# Altium footprint library MC1.PcbLib: 70 footprints (part 2 of 5)
Each footprint in its own frame and in the unit in brackets; x right, y up, seen from the top. Pads: shape width x height; smd on the part's side, far side on the other; paste and mask are expansions set on the pad; w line width, h text height; cw(c..) or ccw(c..) is an arc to the next point about the centre after c.
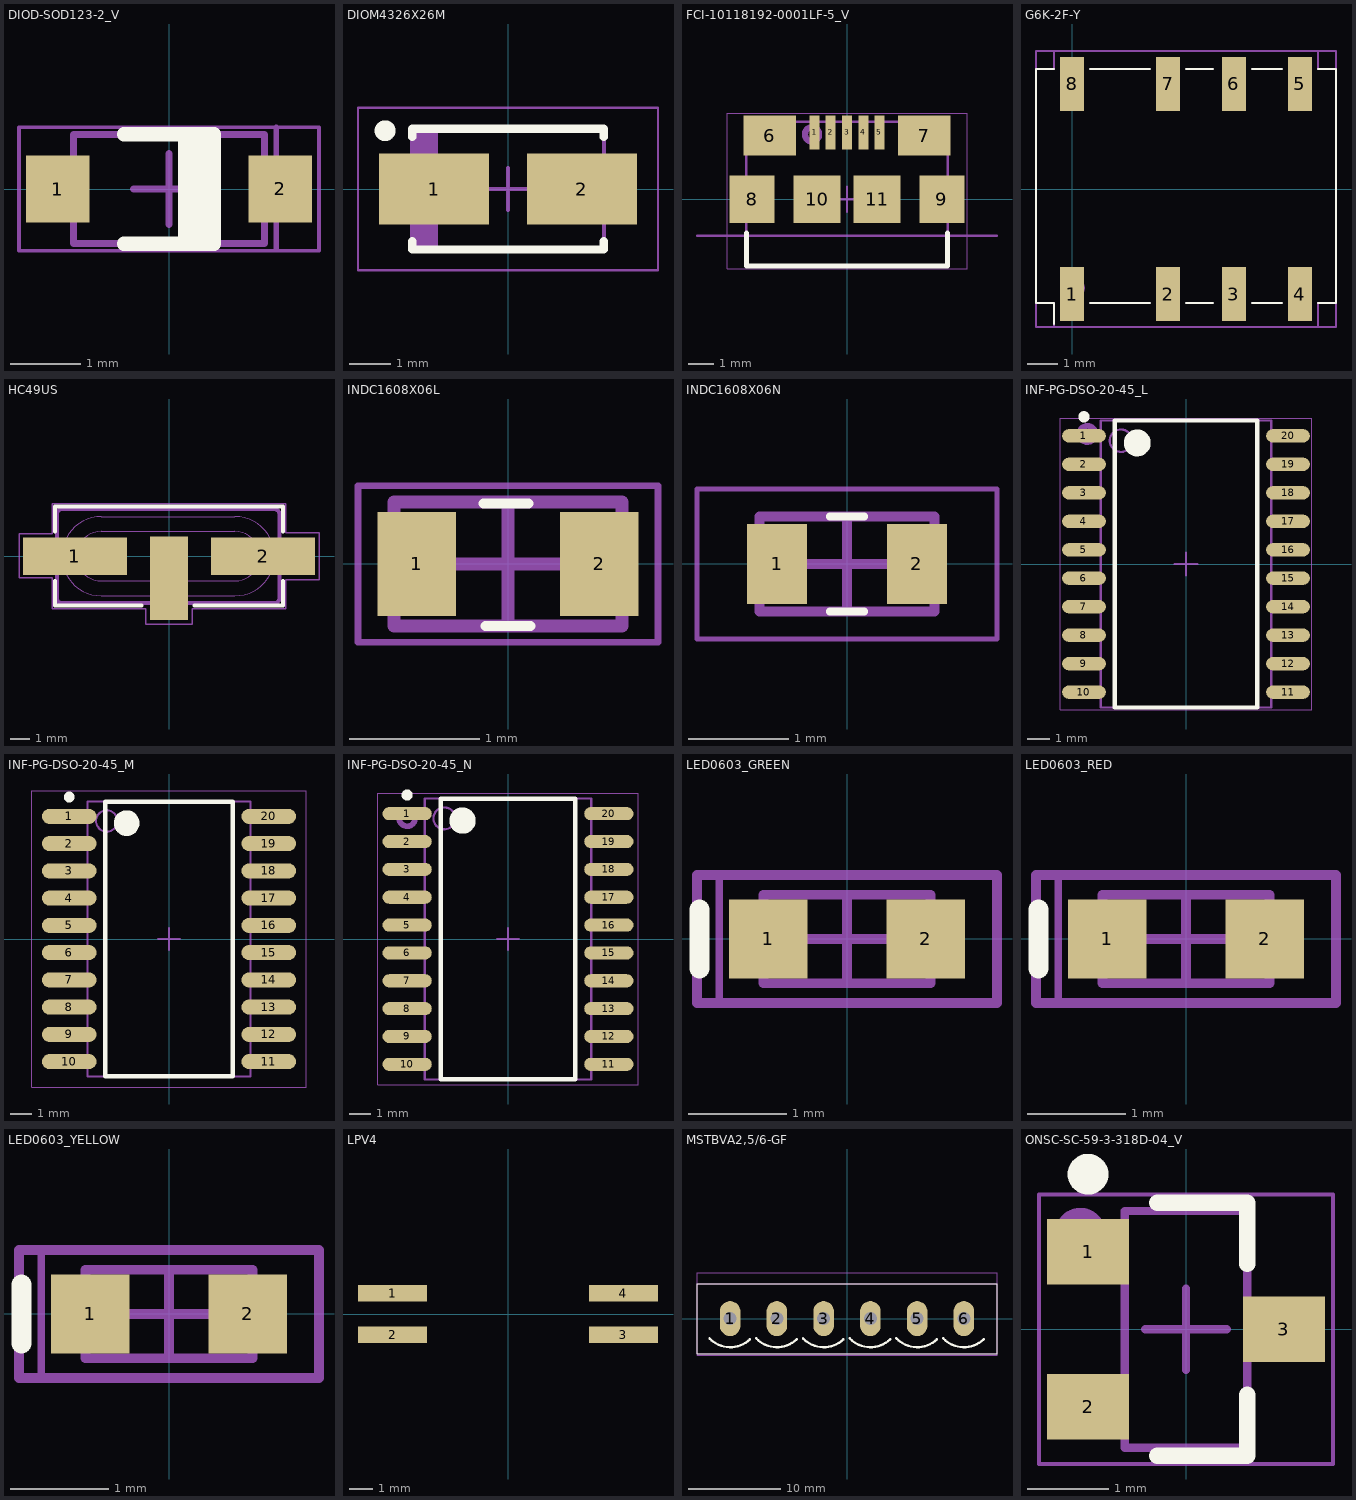
[diagram p1: the footprints below, top view; thin cyan lines are the x and y axes]

## DIOD-SOD123-2_V [mm] "SOD123, 2-Leads, Body 2.7x1.55mm, Height 1.45mm"
height 1.45
pads (2):
  rect 0.9x0.95 smd: 1(-1.575,0) 2(1.575,0)
Top Overlay:
  rectangle: 0.127,-0.825 0.635,0.762
  lines w0.2: -0.635,-0.775 0.635,-0.775 0.635,0.775 -0.635,0.775
Top Courtyard:
  lines w0.05: -2.125,-0.875 -2.125,0.875 2.125,0.875 2.125,-0.875 -2.125,-0.875
  lines w0.1: -0.5,0 0.5,0 ; 0,-0.5 0,0.5
Mechanical 13:
  lines w0.1: -1.35,-0.775 -1.35,0.775 1.35,0.775 1.35,-0.775 -1.35,-0.775
Mechanical 15:
  lines w0.05: -2.125,-0.875 -2.125,0.875 2.125,0.875 2.125,-0.875 -2.125,-0.875
  lines w0.1: -0.5,0 0.5,0 ; 0,-0.5 0,0.5
Top Assembly (Mech29):
  lines w0.05: -2.125,-0.875 -2.125,0.875 2.125,0.875 2.125,-0.875 -2.125,-0.875
  lines w0.076: 1.521,-0.86 1.521,0.875
  text "'.Designator'" at -2.878,-0.212 h0.51
3D body: height 1.45, standoff 0, extent -1.35,-0.775 1.35,0.775

## DIOM4326X26M [mm] "Molded Diode, 2-Leads, Body 4.28x2.58mm, IPC Low Density"
height 2.65
pads (2):
  rect 2.65x1.7 smd: 1(-1.775,0) 2(1.775,0)
Top Overlay:
  circle w0.25: c-2.95,1.4 r0.125
  lines w0.2: -2.3,-1.25 -2.3,-1.45 2.3,-1.45 2.3,-1.25 ; -2.3,1.25 -2.3,1.45 2.3,1.45 2.3,1.25
Top Courtyard:
  lines w0.05: -3.6,-1.95 -3.6,1.95 3.6,1.95 3.6,-1.95 -3.6,-1.95
  lines w0.1: -0.5,0 0.5,0 ; 0,-0.5 0,0.5
Top Assembly (Mech29):
  rectangle: -2.3,-1.45 -1.681,1.45
  lines w0.1: -2.3,-1.45 -2.3,1.45 2.3,1.45 2.3,-1.45 -2.3,-1.45
  text "'.Designator'" at -2.878,-0.212 h0.51
3D body "DIOM4326X26M.step": height 2.65, standoff 0, extent -2.52,-1.45 2.52,1.45

## FCI-10118192-0001LF-5_V [mm] "SMD, 5-Leads, Body 8.05x5.77mm, Pitch 0.65mm"
height 2.7
pads (11):
  rect 0.4x1.35 smd: 1(-1.3,2.675) 2(-0.65,2.675) 3(0,2.675) 4(0.65,2.675) 5(1.3,2.675)
  rect 2.1x1.6 smd: 6(-3.1,2.55) 7(3.1,2.55)
  rect 1.8x1.9 smd: 8(-3.8,0) 9(3.8,0)
  rect 1.9x1.9 smd: 10(-1.2,0) 11(1.2,0)
Top Overlay:
  lines w0.2: -4.025,-1.35 -4.025,-2.67 4.025,-2.67 4.025,-1.35
Mechanical 1:
  lines w0.1: -6,-1.45 6,-1.45
  text "PCB Edge" at -13.208,-0.762 h1
Top Courtyard:
  lines w0.05: -4.8,-2.77 -4.8,3.45 4.8,3.45 4.8,-2.77 -4.8,-2.77
  lines w0.1: -0.5,0 0.5,0 ; 0,-0.5 0,0.5
Mechanical 13:
  lines w0.1: -4.025,-2.67 -4.025,3.1 4.025,3.1 4.025,-2.67 -4.025,-2.67
Mechanical 15:
  lines w0.05: -4.8,-2.77 -4.8,3.45 4.8,3.45 4.8,-2.77 -4.8,-2.77
  lines w0.1: -0.5,0 0.5,0 ; 0,-0.5 0,0.5
Top Assembly (Mech29):
  circle w0.254: c-1.4,2.6 r0.283
  lines w0.05: -4.8,-2.77 -4.8,3.45 4.8,3.45 4.8,-2.77 -4.8,-2.77
  text "'.Designator'" at -2.878,-0.212 h0.51
3D body "User Library-10118192.STEP": height 2.78, standoff -0.23, extent -3.956,-2.986 3.956,2.675

## G6K-2F-Y [mm] "Footprint for G6K-2F-Y Omrom relays"
pads (8):
  rect 0.8x1.8 smd paste+0 mask+0.102: 1(0,-3.5) 2(3.2,-3.5) 3(5.4,-3.5) 4(7.6,-3.5) 5(7.6,3.5) 6(5.4,3.5) 7(3.2,3.5) 8(0,3.5)
Top Overlay:
  lines w0.076: -0.6,-4.5 -0.6,-3.8 -1.2,-3.8 -1.2,4 -0.6,4 ; 0.6,-3.8 2.6,-3.8 ; 0.6,4 2.6,4 ; 3.8,-3.8 4.7,-3.8 ; 3.8,4 4.7,4 ; 6,-3.8 7,-3.8 ; 6,4 7,4 ; 8.2,-3.8 8.8,-3.8 8.8,4 8.2,4
Top Courtyard:
  lines w0.076: -0.6,-4.6 -0.6,-4.6 ; -0.6,-4.6 -0.6,-3.8 -1.2,-3.8 -1.2,4 -0.6,4 -0.6,4.6 8.2,4.6 8.2,4 8.8,4 8.8,3.4 8.8,-3.8 8.2,-3.8 8.2,-4.6 -0.6,-4.6
Top Assembly (Mech29):
  circle w0.254: c0.1,-3.3 r0.2
  lines w0.076: -1.2,-4.6 8.8,-4.6 8.8,4.6 -1.2,4.6 -1.2,-4.6
  text "'.Designator'" at 4.217,-5.865 h1
3D body "G6K-2F.STEP": height 5.21, standoff -0.09, extent -1.2,-3.8 8.8,4

## HC49US [mil]
pads (3):
  rect 210x76 smd: 1(-190,0) 2(190,0)
  rect 76x168 smd: ""(0,-44.63)
Top Overlay:
  lines w8: -230,-50 -230,-100 -55.12,-100 ; -230,50 -230,100 230,100 230,50 ; 51.18,-100 230,-100 230,-50
Top Courtyard:
  lines w3: -303.15,-43.31 -303.15,27.56 -303.15,41.09 -303.15,45.45 -277.74,45.45 -246.24,45.45 -236.22,45.45 -236.22,106.3 236.22,106.3 236.22,47.24 303.15,47.24 303.15,-47.24 236.22,-47.24 236.22,-106.3 47.24,-106.3 47.24,-137.8 -47.24,-137.8 -47.24,-106.3 -236.22,-106.3 -236.22,-43.31 -303.15,-43.31
Top Assembly (Mech29):
  lines w2: -202.96,-45 ccw(c-136.82,0) -136.81,-80 133.19,-80 ccw(c133.19,0) 199.33,-45 ccw(c133.19,0) 199.34,45 ccw(c133.19,0) 133.19,80 -136.81,80 ccw(c-136.81,-0.01) -202.96,45 ccw(c-136.82,0) -202.96,-45 ; -158.61,-45 cw(c-136.82,0) -158.61,45 cw(c-136.81,-0.01) -136.81,50 133.19,50 cw(c133.19,-0.01) 154.99,45 cw(c133.19,0) 154.99,-45 cw(c133.19,0.01) 133.19,-50 -136.81,-50 cw(c-136.81,0.01) -158.61,-45
  lines w8: 223.19,-15 253.19,-15 253.19,15 223.19,15 ; -226.81,-15 -226.81,15 ; -226.81,-15 -226.81,-85 ccw(c-216.81,-85) -216.81,-95 213.19,-95 ccw(c213.19,-85) 223.19,-85 223.19,85 ccw(c213.19,85) 213.19,95 -216.81,95 ccw(c-216.81,85) -226.81,85 -226.81,15 ; -226.81,-15 -256.81,-15 -256.81,15 -226.81,15
  text "'.Designator'" at -113.3,-8.33 h20
3D body "HC49US SMT Crystal.STEP": height 165.86, standoff 0.5, extent -250,-92.52 250,92.52

## INDC1608X06L [mm] "Chip Inductor, 2-Leads, Body 1.60x0.80mm, IPC High Density"
height 0.6
pads (2):
  rect 0.6x0.8 smd: 1(-0.7,0) 2(0.7,0)
Top Overlay:
  lines w0.076: -0.189,0.464 0.158,0.464 ; -0.173,-0.475 0.173,-0.475
Top Courtyard:
  lines w0.05: -1.15,-0.6 1.15,-0.6 1.15,0.6 -1.15,0.6 -1.15,-0.6
  lines w0.1: -0.475,0 0.475,0 ; 0,-0.475 0,0.475
Top Assembly (Mech29):
  lines w0.1: -0.875,-0.475 0.875,-0.475 0.875,0.475 -0.875,0.475 -0.875,-0.475
3D body: height 0.6, standoff 0, extent 0.575,-0.475 0.875,0.475
3D body: height 0.6, standoff 0, extent -0.875,-0.475 -0.575,0.475
3D body: height 0.6, standoff 0, extent -0.575,-0.475 0.575,0.475

## INDC1608X06N [mm] "Chip Inductor, 2-Leads, Body 1.60x0.80mm, IPC Medium Density"
height 0.6
pads (2):
  rect 0.6x0.8 smd: 1(-0.7,0) 2(0.7,0)
Top Overlay:
  lines w0.076: -0.173,-0.475 0.173,-0.475 ; -0.173,0.475 0.173,0.475
Top Courtyard:
  lines w0.05: -1.5,-0.75 -1.5,0.75 1.5,0.75 1.5,-0.75 -1.5,-0.75
  lines w0.1: -0.475,0 0.475,0 ; 0,-0.475 0,0.475
Top Assembly (Mech29):
  lines w0.1: -0.875,-0.475 -0.875,0.475 0.875,0.475 0.875,-0.475 -0.875,-0.475
3D body "INDC1608X06N.step": height 0.6, standoff 0, extent -0.875,-0.475 0.875,0.475

## INF-PG-DSO-20-45_L [mm] "SOP, 20-Leads, Body 12.7x7.5mm, Pitch 1.27mm, IPC High Density"
height 2.65
pads (20):
  oval 1.95x0.6 smd: 1(-4.55,5.715) 2(-4.55,4.445) 3(-4.55,3.175) 4(-4.55,1.905) 5(-4.55,0.635) 6(-4.55,-0.635) 7(-4.55,-1.905) 8(-4.55,-3.175) 9(-4.55,-4.445) 10(-4.55,-5.715) 11(4.55,-5.715) 12(4.55,-4.445) 13(4.55,-3.175) 14(4.55,-1.905) 15(4.55,-0.635) 16(4.55,0.635) 17(4.55,1.905) 18(4.55,3.175) 19(4.55,4.445) 20(4.55,5.715)
Top Overlay:
  circle w0.25: c-4.55,6.565 r0.125
  circle w0.6: c-2.175,5.4 r0.3
  lines w0.2: -3.175,-6.4 -3.175,6.4 3.175,6.4 3.175,-6.4 -3.175,-6.4
Top Courtyard:
  lines w0.05: -5.6,-6.5 -5.6,6.5 5.6,6.5 5.6,-6.5 -5.6,-6.5
Mechanical 13:
  circle w0.1: c-2.9,5.5 r0.5
  lines w0.1: -3.8,-6.4 -3.8,6.4 3.8,6.4 3.8,-6.4 -3.8,-6.4
Mechanical 15:
  lines w0.05: -5.6,-6.5 -5.6,6.5 5.6,6.5 5.6,-6.5 -5.6,-6.5
  lines w0.1: -0.5,0 0.5,0 ; 0,-0.5 0,0.5
Top Assembly (Mech29):
  circle w0.254: c-4.4,5.8 r0.361
  lines w0.05: -5.6,-6.5 -5.6,6.5 5.6,6.5 5.6,-6.5 -5.6,-6.5
  text "'.Designator'" at -5.665,-0.417 h1
3D body: height 2.65, standoff 0.1, extent -3.8,-6.4 3.8,6.4

## INF-PG-DSO-20-45_M [mm] "SOP, 20-Leads, Body 12.7x7.5mm, Pitch 1.27mm, IPC Low Density"
height 2.65
pads (20):
  oval 2.55x0.7 smd: 1(-4.65,5.715) 2(-4.65,4.445) 3(-4.65,3.175) 4(-4.65,1.905) 5(-4.65,0.635) 6(-4.65,-0.635) 7(-4.65,-1.905) 8(-4.65,-3.175) 9(-4.65,-4.445) 10(-4.65,-5.715) 11(4.65,-5.715) 12(4.65,-4.445) 13(4.65,-3.175) 14(4.65,-1.905) 15(4.65,-0.635) 16(4.65,0.635) 17(4.65,1.905) 18(4.65,3.175) 19(4.65,4.445) 20(4.65,5.715)
Top Overlay:
  circle w0.25: c-4.65,6.615 r0.125
  circle w0.6: c-1.975,5.4 r0.3
  lines w0.2: -2.975,-6.4 -2.975,6.4 2.975,6.4 2.975,-6.4 -2.975,-6.4
Top Courtyard:
  lines w0.05: -6.4,-6.9 -6.4,6.9 6.4,6.9 6.4,-6.9 -6.4,-6.9
Mechanical 13:
  circle w0.1: c-2.9,5.5 r0.5
  lines w0.1: -3.8,-6.4 -3.8,6.4 3.8,6.4 3.8,-6.4 -3.8,-6.4
Mechanical 15:
  lines w0.05: -6.4,-6.9 -6.4,6.9 6.4,6.9 6.4,-6.9 -6.4,-6.9
  lines w0.1: -0.5,0 0.5,0 ; 0,-0.5 0,0.5
Top Assembly (Mech29):
  circle w0.254: c-4.5,5.7 r0.224
  lines w0.05: -6.4,-6.9 -6.4,6.9 6.4,6.9 6.4,-6.9 -6.4,-6.9
  text "'.Designator'" at -5.665,-0.417 h1
3D body: height 2.65, standoff 0.1, extent -3.8,-6.4 3.8,6.4

## INF-PG-DSO-20-45_N [mm] "SOP, 20-Leads, Body 12.7x7.5mm, Pitch 1.27mm, IPC Medium Density"
height 2.65
pads (20):
  oval 2.25x0.6 smd: 1(-4.6,5.715) 2(-4.6,4.445) 3(-4.6,3.175) 4(-4.6,1.905) 5(-4.6,0.635) 6(-4.6,-0.635) 7(-4.6,-1.905) 8(-4.6,-3.175) 9(-4.6,-4.445) 10(-4.6,-5.715) 11(4.6,-5.715) 12(4.6,-4.445) 13(4.6,-3.175) 14(4.6,-1.905) 15(4.6,-0.635) 16(4.6,0.635) 17(4.6,1.905) 18(4.6,3.175) 19(4.6,4.445) 20(4.6,5.715)
Top Overlay:
  circle w0.25: c-4.6,6.565 r0.125
  circle w0.6: c-2.075,5.4 r0.3
  lines w0.2: -3.075,-6.4 -3.075,6.4 3.075,6.4 3.075,-6.4 -3.075,-6.4
Top Courtyard:
  lines w0.05: -5.95,-6.65 -5.95,6.65 5.95,6.65 5.95,-6.65 -5.95,-6.65
Mechanical 13:
  circle w0.1: c-2.9,5.5 r0.5
  lines w0.1: -3.8,-6.4 -3.8,6.4 3.8,6.4 3.8,-6.4 -3.8,-6.4
Mechanical 15:
  lines w0.05: -5.95,-6.65 -5.95,6.65 5.95,6.65 5.95,-6.65 -5.95,-6.65
  lines w0.1: -0.5,0 0.5,0 ; 0,-0.5 0,0.5
Top Assembly (Mech29):
  circle w0.254: c-4.6,5.5 r0.361
  lines w0.05: -5.95,-6.65 -5.95,6.65 5.95,6.65 5.95,-6.65 -5.95,-6.65
  text "'.Designator'" at -5.665,-0.417 h1
3D body: height 2.65, standoff 0.1, extent -3.8,-6.4 3.8,6.4

## LED0603_GREEN [mm] "Chip LED, 2-Leads, Body 1.6x0.8mm, IPC Medium Density"
height 0.68
pads (2):
  rect 0.8x0.8 smd: 1(-0.8,0) 2(0.8,0)
Top Overlay:
  lines w0.2: -1.5,-0.3 -1.5,0.3
Top Courtyard:
  lines w0.1: -0.45,0 0.45,0 ; 0,-0.45 0,0.45 ; -1.525,-0.65 -1.525,0.65 1.525,0.65 1.525,-0.65 -1.525,-0.65
Mechanical 13:
  lines w0.1: -0.85,-0.45 -0.85,0.45 0.85,0.45 0.85,-0.45 -0.85,-0.45
Mechanical 15:
  lines w0.1: -0.45,0 0.45,0 ; 0,-0.45 0,0.45 ; -1.525,-0.65 -1.525,0.65 1.525,0.65 1.525,-0.65 -1.525,-0.65
Top Assembly (Mech29):
  lines w0.076: -1.3,-0.6 -1.3,0.6
  lines w0.1: -1.525,-0.65 -1.525,0.65 1.525,0.65 1.525,-0.65 -1.525,-0.65
  text "'.Designator'" at -2.878,-0.212 h0.51
3D body "WL-SMCW_0603_LED.stp": height 0.7, standoff 0, extent -0.8,-0.4 0.8,0.4
3D body "LED 0603 Lens RED.STEP": height 0.73, standoff 0.38, extent -0.55,-0.4 0.55,0.4

## LED0603_RED [mm] "Chip LED, 2-Leads, Body 1.6x0.8mm, IPC Medium Density"
height 0.68
pads (2):
  rect 0.8x0.8 smd: 1(-0.8,0) 2(0.8,0)
Top Overlay:
  lines w0.2: -1.5,-0.3 -1.5,0.3
Top Courtyard:
  lines w0.1: -0.45,0 0.45,0 ; 0,-0.45 0,0.45 ; -1.525,-0.65 1.525,-0.65 1.525,0.65 -1.525,0.65 -1.525,-0.65
Mechanical 13:
  lines w0.1: -0.85,-0.45 0.85,-0.45 0.85,0.45 -0.85,0.45 -0.85,-0.45
Mechanical 15:
  lines w0.1: -0.45,0 0.45,0 ; 0,-0.45 0,0.45 ; -1.525,-0.65 1.525,-0.65 1.525,0.65 -1.525,0.65 -1.525,-0.65
Top Assembly (Mech29):
  lines w0.076: -1.3,-0.6 -1.3,0.6
  lines w0.1: -1.525,-0.65 1.525,-0.65 1.525,0.65 -1.525,0.65 -1.525,-0.65
  text "'.Designator'" at -2.878,-0.212 h0.51
3D body "LED 0603 Lens RED.STEP": height 0.73, standoff 0.38, extent -0.55,-0.4 0.55,0.4
3D body "WL-SMCW_0603_LED.stp": height 0.7, standoff 0, extent -0.8,-0.4 0.8,0.4

## LED0603_YELLOW [mm] "Chip LED, 2-Leads, Body 1.6x0.8mm, IPC Medium Density"
height 0.68
pads (2):
  rect 0.8x0.8 smd: 1(-0.8,0) 2(0.8,0)
Top Overlay:
  lines w0.2: -1.5,-0.3 -1.5,0.3
Top Courtyard:
  lines w0.1: -0.45,0 0.45,0 ; 0,-0.45 0,0.45 ; -1.525,-0.65 1.525,-0.65 1.525,0.65 -1.525,0.65 -1.525,-0.65
Mechanical 13:
  lines w0.1: -0.85,-0.45 0.85,-0.45 0.85,0.45 -0.85,0.45 -0.85,-0.45
Mechanical 15:
  lines w0.1: -0.45,0 0.45,0 ; 0,-0.45 0,0.45 ; -1.525,-0.65 1.525,-0.65 1.525,0.65 -1.525,0.65 -1.525,-0.65
Top Assembly (Mech29):
  lines w0.076: -1.3,-0.6 -1.3,0.6
  lines w0.1: -1.525,-0.65 1.525,-0.65 1.525,0.65 -1.525,0.65 -1.525,-0.65
  text "'.Designator'" at -2.878,-0.212 h0.51
3D body "LED 0603 Lens RED.STEP": height 0.73, standoff 0.38, extent -0.55,-0.4 0.55,0.4
3D body "WL-SMCW_0603_LED.stp": height 0.7, standoff 0, extent -0.8,-0.4 0.8,0.4

## LPV4 [mm] "Footprint for LPV4 led (Figure B) with pipe lenses"
pads (4):
  rect 3x0.7 smd paste+0 mask+0.102: 1(-5,0.9) 2(-5,-0.9) 3(5,-0.9) 4(5,0.9)

## MSTBVA2,5/6-GF [mm] "Package for 1755778"
pads (6):
  oval 2.23x3.81 hole 1.397 paste+0 mask+0.102: 1(-12.7,0) 2(-7.62,0) 3(-2.54,0) 4(2.54,0) 5(7.62,0) 6(12.7,0)
Top Overlay:
  lines w0.076: -16.3,-3.8 16.3,-3.8 16.3,3.8 -16.3,3.8 -16.3,-3.8
  lines w0.254: -14.95,-2.15 ccw(c-12.7,0) -10.55,-2.25 ; -9.87,-2.15 ccw(c-7.62,0) -5.47,-2.25 ; -4.79,-2.15 ccw(c-2.54,0) -0.39,-2.25 ; 0.29,-2.15 ccw(c2.54,0) 4.69,-2.25 ; 5.37,-2.15 ccw(c7.62,0) 9.77,-2.25 ; 10.45,-2.15 ccw(c12.7,0) 14.85,-2.25
Top Courtyard:
  lines w0.076: -16.3,-4 16.3,-4 16.3,5 -16.3,5 -16.3,-4
Top Assembly (Mech29):
  circle w0.254: c-12.7,0 r0.424
  lines w0.076: -16.3,-3.8 16.3,-3.8 16.3,3.8 -16.3,3.8 -16.3,-3.8
  text "'.Designator'" at -5.665,-0.417 h1
3D body "1755778.stp": height 12.01, standoff -3.89, extent -16.24,-3.8 16.24,4.8

## ONSC-SC-59-3-318D-04_V [mm] "SOT23, 3-Leads, Body 2.9x1.5mm, Pitch 0.95mm"
height 1.3
pads (3):
  rect 1x0.8 smd: 1(-1.2,0.95) 2(-1.2,-0.95) 3(1.2,0)
Top Overlay:
  circle w0.25: c-1.2,1.9 r0.125
  lines w0.2: -0.354,-1.55 0.75,-1.55 0.75,-0.8 ; -0.354,1.55 0.75,1.55 0.75,0.8
Top Courtyard:
  lines w0.05: -1.8,-1.65 -1.8,1.65 1.8,1.65 1.8,-1.65 -1.8,-1.65
  lines w0.1: -0.5,0 0.5,0 ; 0,-0.5 0,0.5
Mechanical 13:
  lines w0.1: -0.75,-1.45 -0.75,1.45 0.75,1.45 0.75,-1.45 -0.75,-1.45
Mechanical 15:
  lines w0.05: -1.8,-1.65 -1.8,1.65 1.8,1.65 1.8,-1.65 -1.8,-1.65
  lines w0.1: -0.5,0 0.5,0 ; 0,-0.5 0,0.5
Top Assembly (Mech29):
  circle w0.254: c-1.294,1.179 r0.182
  lines w0.05: -1.8,-1.65 -1.8,1.65 1.8,1.65 1.8,-1.65 -1.8,-1.65
  text "'.Designator'" at -2.878,-0.212 h0.51
3D body "User Library-P-SC 59-3-X HALL EFFECT.step": height 1.4, standoff 0, extent -1.399,-1.5 1.4,1.5